# Altium footprint library ATROTECH.PcbLib: 334 footprints (part 8 of 21)
Each footprint in its own frame and in the unit in brackets; x right, y up, seen from the top. Pads: shape width x height; smd on the part's side, far side on the other; paste and mask are expansions set on the pad; w line width, h text height; cw(c..) or ccw(c..) is an arc to the next point about the centre after c.
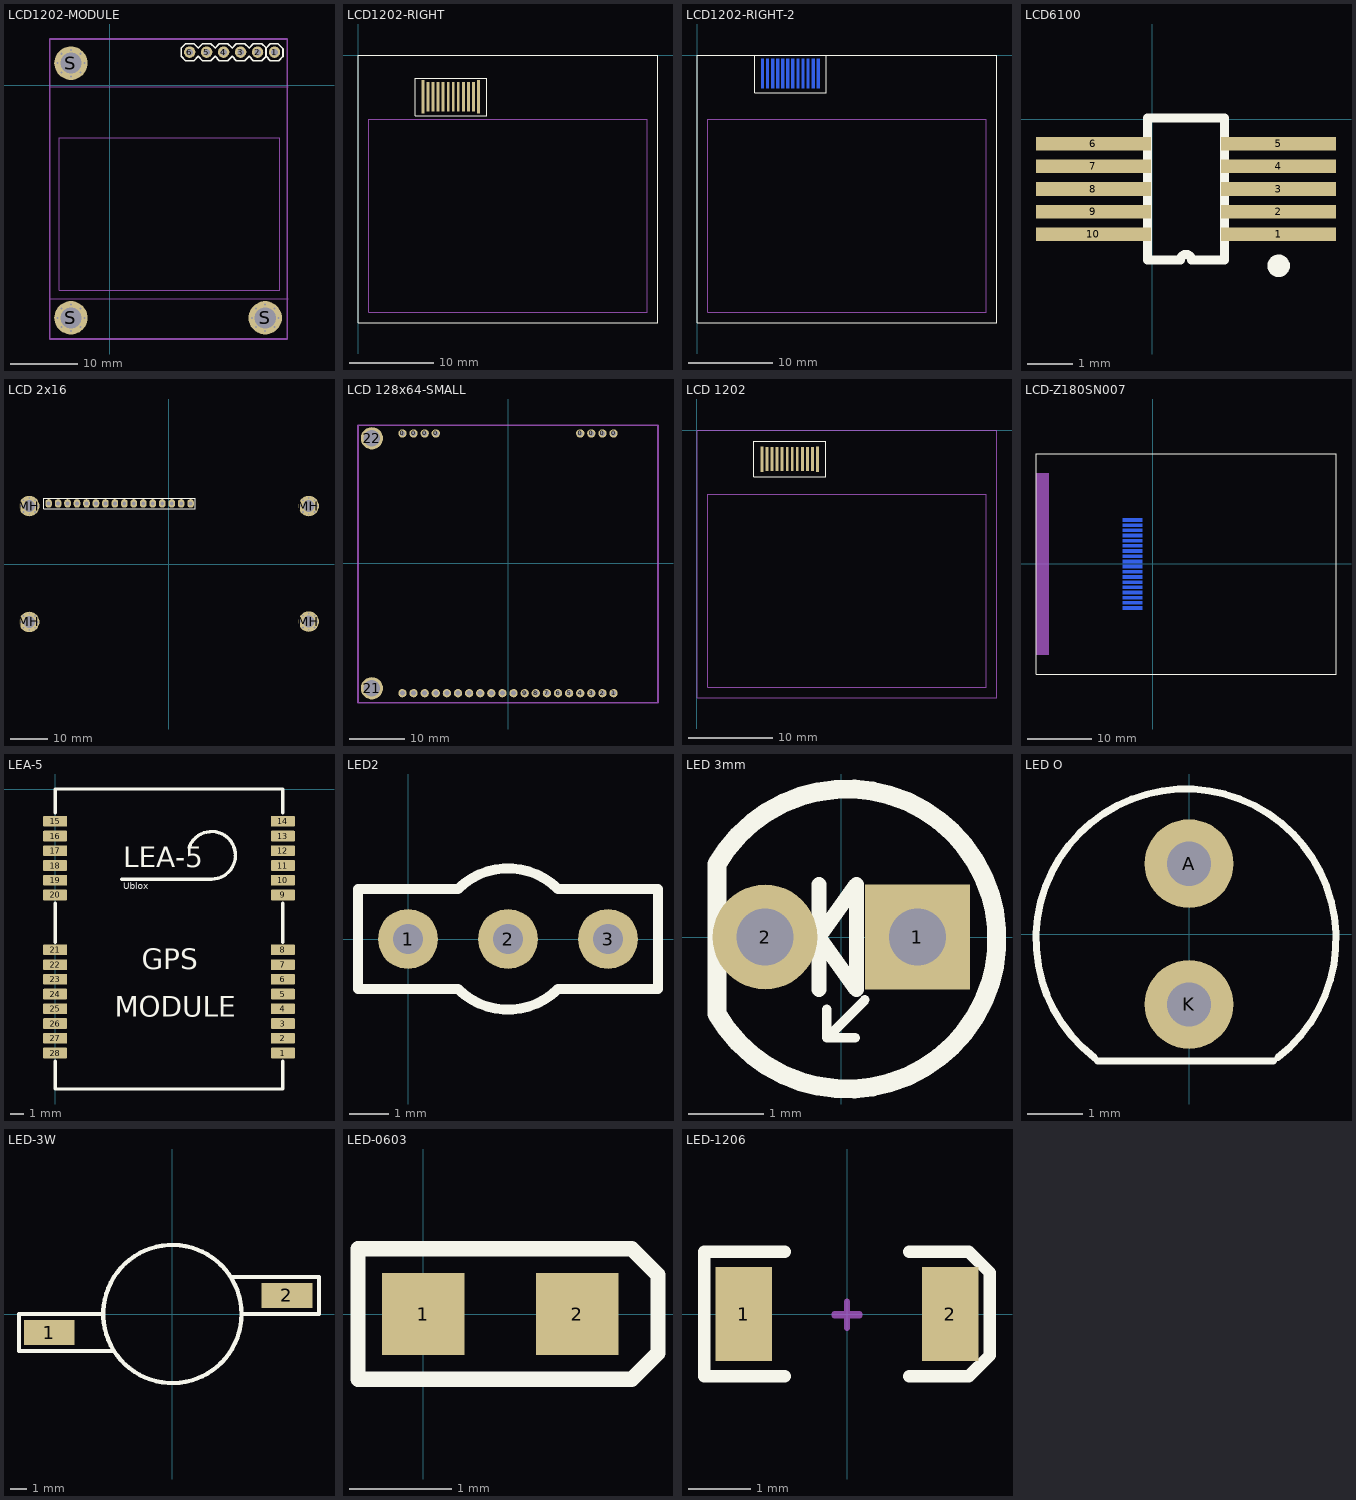
[diagram p7: the footprints below, top view; thin cyan lines are the x and y axes]

## LCD1202-MODULE [mm]
pads (33):
  round 1.7 hole 1: 1(24.638,4.953) 2(22.098,4.953) 3(19.558,4.953) 4(17.018,4.953) 5(14.478,4.953) 6(11.938,4.953)
  round 0.6 hole 0.3: S(-7.842,-34.798) S(-7.842,3.302) S(-7.256,-36.212) S(-7.256,-33.384) S(-7.256,1.888) S(-7.256,4.716) S(-5.842,-36.798) S(-5.842,-32.798) S(-5.842,1.302) S(-5.842,5.302) S(-4.428,-36.212) S(-4.428,-33.384) S(-4.428,1.888) S(-4.428,4.716) S(-3.842,-34.798) S(-3.842,3.302) S(21.241,-34.798) S(21.827,-36.212) S(21.827,-33.384) S(23.241,-36.798) S(23.241,-32.798) S(24.655,-36.212) S(24.655,-33.384) S(25.241,-34.798)
  round 5 hole 3.15 mask+0.1: S(-5.842,-34.798) S(-5.842,3.302) S(23.241,-34.798)
Top Overlay:
  lines w0.254: 19.558,6.223 20.193,6.223 20.828,5.588 21.463,6.223 22.098,6.223 22.733,6.223 23.368,5.588 ; 20.066,6.223 18.923,6.223 18.288,5.588 17.653,6.223 17.018,6.223 ; 16.383,6.223 15.748,5.588 15.113,6.223 14.478,6.223 13.843,6.223 13.208,5.588 12.573,6.223 11.938,6.223 11.303,6.223 10.668,5.588 10.668,4.318 11.303,3.683 12.573,3.683 13.208,4.318 13.843,3.683 15.113,3.683 15.748,4.318 16.383,3.683 17.653,3.683 18.288,4.318 18.923,3.683 20.193,3.683 20.828,4.318 21.463,3.683 22.733,3.683 23.368,4.318 ; 16.383,6.223 17.018,6.223 ; 16.383,6.223 17.018,6.223 ; 23.368,4.318 23.368,5.588 ; 23.368,4.318 24.003,3.683 25.273,3.683 25.908,4.318 25.908,5.461 25.146,6.223 24.003,6.223 23.368,5.588
Mechanical 1:
  lines w0.127: -8.865,-31.979 26.695,-31.979 ; -8.865,-0.229 26.695,-0.229 ; -7.595,-30.709 25.425,-30.709 25.425,-7.849 -7.595,-7.849 -7.595,-30.709
  lines w0.254: -9.017,-37.973 -9.017,6.923 26.518,6.923 26.518,-37.973 -9.017,-37.973
3D body: height 10, standoff 0, extent -8.042,1.102 -3.642,5.502
3D body: height 10, standoff 0, extent -8.042,-36.998 -3.642,-32.598
3D body: height 10, standoff 0, extent 21.041,-36.998 25.441,-32.598
3D body "LCD1202.step": height 9, standoff -3.47, extent -8.966,-38.039 26.746,6.858

## LCD1202-RIGHT [mm]
pads (12):
  rect 0.33x4 smd: 0(7.69,-4.928) 11(14.29,-4.928)
  rect 0.33x3.5 smd: 1(8.29,-4.928) 2(8.89,-4.928) 3(9.49,-4.928) 4(10.09,-4.928) 5(10.69,-4.928) 6(11.29,-4.928) 7(11.89,-4.928) 8(12.49,-4.928) 9(13.09,-4.928) 10(13.69,-4.928)
Top Overlay:
  lines w0.127: 0,-31.75 0,0 35.56,0 35.56,-31.75 0,-31.75 ; 6.782,-7.188 6.782,-2.718 15.272,-2.718 15.272,-7.188 6.782,-7.188
Mechanical 16:
  lines w0.127: 1.27,-30.48 1.27,-7.62 34.29,-7.62 34.29,-30.48 1.27,-30.48

## LCD1202-RIGHT-2 [mm]
pads (12):
  rect 0.33x3.5 smd far side: 0(7.766,-2.21) 1(8.366,-2.21) 2(8.966,-2.21) 3(9.566,-2.21) 4(10.166,-2.21) 5(10.766,-2.21) 6(11.366,-2.21) 7(11.966,-2.21) 8(12.566,-2.21) 9(13.166,-2.21) 10(13.766,-2.21) 11(14.366,-2.21)
Top Overlay:
  lines w0.127: 6.858,0 6.858,-4.47 15.348,-4.47 15.348,0 ; 0,-31.75 0,0 35.56,0 35.56,-31.75 0,-31.75
Mechanical 16:
  lines w0.127: 1.27,-30.48 1.27,-7.62 34.29,-7.62 34.29,-30.48 1.27,-30.48
3D body: height 1.6, standoff 0, extent 0.635,-6.985 34.925,-0.635
3D body: height 2, standoff 0, extent 1.27,-30.48 34.29,-7.62
3D body: height 1.5, standoff 0, extent 0,-31.75 35.56,0

## LCD6100 [mm]
pads (10):
  rect 2.54x0.3 smd: 1(2.794,-2.54) 2(2.794,-2.04) 3(2.794,-1.54) 4(2.794,-1.04) 5(2.794,-0.54) 6(-1.306,-0.54) 7(-1.306,-1.04) 8(-1.306,-1.54) 9(-1.306,-2.04) 10(-1.306,-2.54)
Top Overlay:
  circle w0.25: c2.794,-3.24 r0.125
  lines w0.2: -0.106,-3.115 -0.106,0.035 1.594,0.035 1.594,-3.115 0.869,-3.115 ccw(c0.744,-3.115) 0.619,-3.115 -0.106,-3.115

## LCD 2x16 [mm] "Character LCD, 2 Row, 16 Colunm"
height 1
pads (52):
  oval 1.778x2.286 hole 1.016: 1(-32.3,16.25) 2(-29.76,16.25) 3(-27.22,16.25) 4(-24.68,16.25) 5(-22.14,16.25) 6(-19.6,16.25) 7(-17.06,16.25) 8(-14.52,16.25) 9(-11.98,16.25) 10(-9.44,16.25) 11(-6.9,16.25) 12(-4.36,16.25) 13(-1.82,16.25) 14(0.72,16.25) 15(3.26,16.25) 16(5.8,16.25)
  round 0.6 hole 0.5: MH(-39.7,-15.55) MH(-39.7,15.55) MH(-39.056,-17.106) MH(-39.056,-13.994) MH(-39.056,13.994) MH(-39.056,17.106) MH(-37.5,-17.75) MH(-37.5,-13.35) MH(-37.5,13.35) MH(-37.5,17.75) MH(-35.944,-17.106) MH(-35.944,-13.994) MH(-35.944,13.994) MH(-35.944,17.106) MH(-35.3,-15.55) MH(-35.3,15.55) MH(35.3,-15.45) MH(35.3,15.55) MH(35.944,-17.006) MH(35.944,-13.894) MH(35.944,13.994) MH(35.944,17.106) MH(37.5,-17.65) MH(37.5,-13.25) MH(37.5,13.35) MH(37.5,17.75) MH(39.056,-17.006) MH(39.056,-13.894) MH(39.056,13.994) MH(39.056,17.106) MH(39.7,-15.45) MH(39.7,15.55)
  round 5.5 hole 3.2: MH(-37.5,-15.55) MH(-37.5,15.55) MH(37.5,-15.45) MH(37.5,15.55)
Top Overlay:
  lines w0.254: -33.6,14.8 -33.6,17.6 7.1,17.6 7.1,14.8 -33.6,14.8
3D body "header16-15mm.STEP": height 18.03, standoff -2.54, extent -33.57,14.98 7.07,17.52
3D body "My LCD.STEP": height 21.52, standoff 8.31, extent -40.234,-18.39 40.266,18.11
3D body: height 11, standoff 0, extent -39.98,13.055 -35,18.045
3D body: height 11, standoff 0, extent -39.98,-18.045 -35,-13.055
3D body: height 11, standoff 0, extent 35.02,-17.945 40,-12.955
3D body: height 11, standoff 0, extent 35.02,13.055 40,18.045

## LCD 128x64-SMALL [mm]
pads (30):
  round 1.5 hole 0.9: 0(-19,23.375) 0(-17,23.375) 0(-15,23.375) 0(-13,23.375) 0(13,23.375) 0(15,23.375) 0(17,23.375) 0(19,23.375) 1(19,-23.375) 2(17,-23.375) 3(15,-23.375) 4(13,-23.375) 5(11,-23.375) 6(9,-23.375) 7(7,-23.375) 8(5,-23.375) 9(3,-23.375) 10(1,-23.375) 11(-1,-23.375) 12(-3,-23.375) 13(-5,-23.375) 14(-7,-23.375) 15(-9,-23.375) 16(-11,-23.375) 17(-13,-23.375) 18(-15,-23.375) 19(-17,-23.375) 20(-19,-23.375)
  round 4 hole 3: 21(-24.5,-22.5) 22(-24.5,22.5)
Mechanical 13:
  lines w0.3: -27,-25.125 27,-25.125 27,24.875 -27,24.875 -27,-25.125
3D body "User Library-User Library-WG12864e.step": height 13.2, standoff -4.8, extent -28,-25 27,25

## LCD 1202 [mil] "NOKIA 1202 LCD"
pads (12):
  rect 13x119 smd: 0(303.76,-134) 11(563.6,-134)
  rect 13x111 smd: 1(327.38,-134) 2(351,-134) 3(374.62,-134) 4(398.24,-134) 5(421.87,-134) 6(445.49,-134) 7(469.11,-134) 8(492.73,-134) 9(516.35,-134) 10(539.98,-134)
Top Overlay:
  lines w5: 266.75,-216 601,-216 601,-51 266.75,-51 266.75,-216
Mechanical 1:
  lines w5: 1,-1249 1401,-1249 1401,1 1,1 1,-1249 ; 51,-1199 1351,-1199 1351,-299 51,-299 51,-1199
3D body: height 94.49, standoff 0, extent 50,-1200 1350,-300
3D body: height 78.74, standoff 0, extent 1,-1249 1401,1

## LCD TEXT [mm]

## LCD-Z180SN007 [mm]
pads (18):
  rect 3x0.5 smd far side: 1(-3.1,6.8) 2(-3.1,6) 3(-3.1,5.2) 4(-3.1,4.4) 5(-3.1,3.6) 6(-3.1,2.8) 7(-3.1,2) 8(-3.1,1.2) 9(-3.1,0.4) 10(-3.1,-0.4) 11(-3.1,-1.2) 12(-3.1,-2) 13(-3.1,-2.8) 14(-3.1,-3.6) 15(-3.1,-4.4) 16(-3.1,-5.2) 17(-3.1,-6) 18(-3.1,-6.8)
Top Overlay:
  lines w0.127: -18,-17 28.3,-17 28.3,17 -18,17 -18,-17
Mechanical 15:
  pour cut-out: -16,14 -18,14 -18,-14 -16,-14
3D body "User Library-JD-T18003.step": height 2.6, standoff -0.1, extent -18.027,-17 28.2,17

## LEA-5 [mm] "GPS MODULE"
pads (28):
  rrect20% 1.8x0.8 smd: 1(17,-19.713) 2(17,-18.613) 3(17,-17.513) 4(17,-16.413) 5(17,-15.313) 6(17,-14.213) 7(17,-13.113) 8(17,-12.013) 9(17,-7.913) 10(17,-6.813) 11(17,-5.713) 12(17,-4.613) 13(17,-3.513) 14(17,-2.413) 15(0,-2.413) 16(0,-3.513) 17(0,-4.613) 18(0,-5.713) 19(0,-6.813) 20(0,-7.913) 21(0,-12.013) 22(0,-13.113) 23(0,-14.213) 24(0,-15.313) 25(0,-16.413) 26(0,-17.513) 27(0,-18.613) 28(0,-19.713)
Top Overlay:
  lines w0.254: 0,-20.32 0,-22.4 17,-22.4 17,-20.32 ; 0,-11.43 0,-8.509 ; 0,-1.778 0,0 17,0 17,-1.778 ; 4.953,-6.731 11.684,-6.731 ccw(c11.684,-4.953) 9.997,-4.391 ; 17,-11.43 17,-8.509
  text "Ublox" at 5.08,-7.493 h0.5
  text "MODULE" at 4.445,-17.018 h1.52
  text "GPS" at 6.477,-13.462 h1.52
  text "LEA-5" at 5.08,-5.842 h1.52

## LED2 [mil] "LED 3 LEAD"
height 196.85
pads (3):
  round 60 hole 30: 1(0,0) 2(100,0) 3(200,0)
Top Overlay:
  lines w10: -50,-50 50,-50 ccw(c100,0) 150,-50 250,-50 250,50 150,50 ccw(c100,0) 50,50 -50,50 -50,-50
3D body "User Library-3mmBiColorLED.step": height 362.48, standoff -32.52, extent -10,-79.69 210,79.71

## LED 3mm [mil]
pads (2):
  rect 55x55 hole 30: 1(40,0)
  round 55 hole 30: 2(-40,0)
Top Overlay:
  lines w5: -7.6,-37.95 -7.6,-52.95 ; 7.4,-52.95 -7.6,-52.95 ; 12.4,-32.95 -7.6,-52.95
  lines w7.87: -11.81,-27.56 -11.81,27.56 ; -11.81,0 7.87,-27.56 7.87,27.56 -11.81,0
  lines w10: -65.19,-40.37 ccw(c3,-1) -65.19,38.37 -65.19,-40.37
3D body "LED.STEP": height 153.55, standoff -59.05, extent -68.9,-68.8 68.9,69

## LED O [mm]
pads (2):
  round 1.6 hole 0.8: A(0,1.27) K(0,-1.27)
Top Overlay:
  lines w0.127: -1.707,-2.232 cw(c-0.055,-0.089) 1.604,-2.226 ; -1.651,-2.286 1.524,-2.286

## LED-3W [mm]
pads (2):
  rect 3x1.5 smd: 1(-7.3,-1.1) 2(6.8,1.1)
Top Overlay:
  circle w0.254: c0,0 r4.1
  lines w0.254: -4.2,0 -9.1,0 -9.1,-2.2 -3.5,-2.2 ; 3.5,2.2 8.7,2.2 8.7,0 4.1,0
Top Solder:
  circle w3: c0,0 r1.5
3D body "User Library-3W-Led-1 (1).step": height 5.9, standoff -0.05, extent -7.586,-4 7.086,4

## LED-0603 [mm]
pads (2):
  rect 0.8x0.8 smd: 1(0,0) 2(1.5,0)
Top Overlay:
  lines w0.15: -0.635,-0.635 -0.635,0.635 2.032,0.635 2.286,0.381 2.286,-0.381 2.032,-0.635 -0.635,-0.635
3D body "LED 0603 single color.stp": height 0.7, standoff -0.01, extent -0.038,-0.406 1.562,0.381

## LED-1206 [mm]
pads (2):
  rect 0.9x1.5 smd: 1(-1.651,0) 2(1.651,0)
Top Overlay:
  lines w0.2: -1,-1 -2.286,-1 -2.286,1 -1,1 ; 1,-1 1.946,-1 2.286,-0.66 2.286,0.66 1.956,0.991 ; 1,1 1.949,1
Mechanical 1:
  lines w0.1: -0.2,-0.025 0.2,-0.025 ; -0.2,0 0.2,0 ; 0,-0.225 0,0.175 ; 0,-0.2 0,0.2
3D body "SW3dPS-LED_SMD_SML010L_Red.STEP": height 1.36, standoff 0.01, extent -1.65,-0.762 1.65,0.688